# Altium footprint library Package_DFN_QFN.PcbLib: 557 footprints (part 29 of 35)
Each footprint in its own frame and in the unit in brackets; x right, y up, seen from the top. Pads: shape width x height; smd on the part's side, far side on the other; paste and mask are expansions set on the pad; w line width, h text height; cw(c..) or ccw(c..) is an arc to the next point about the centre after c.
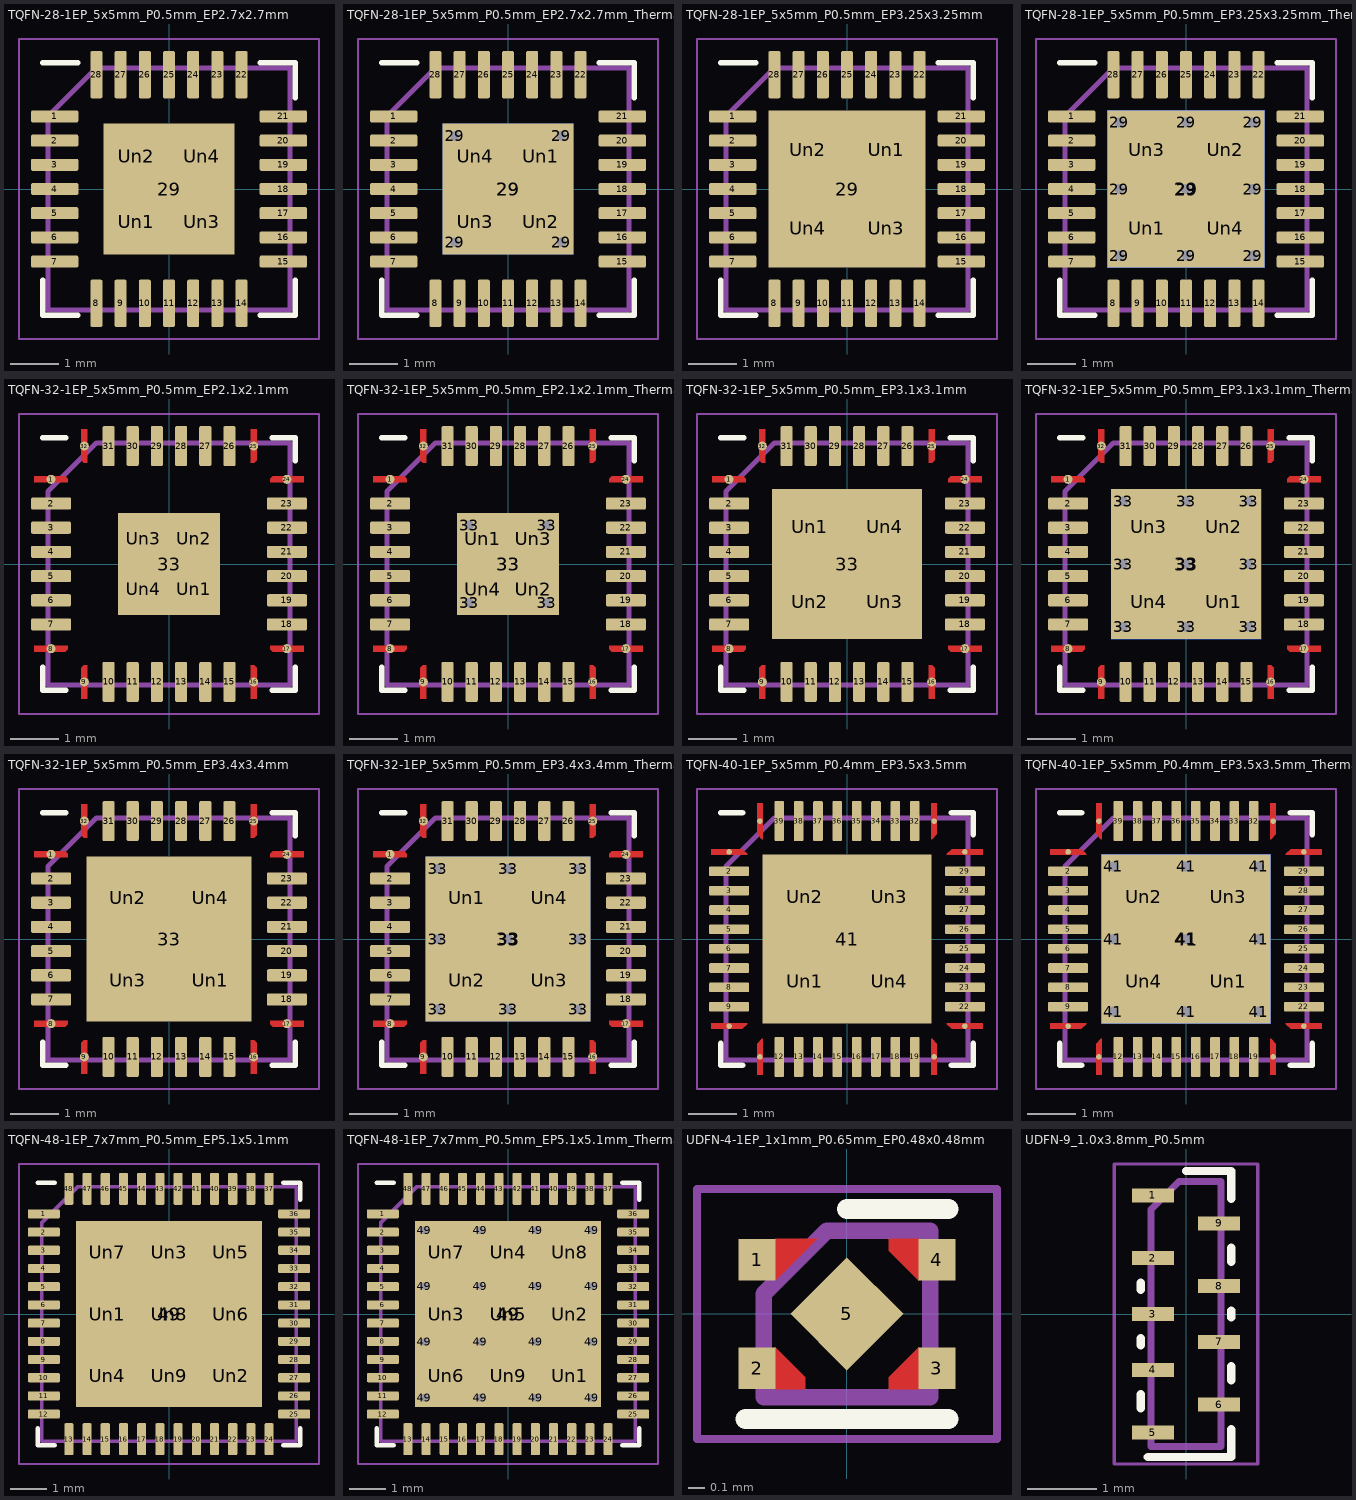
[diagram p28: the footprints below, top view; thin cyan lines are the x and y axes]

## TQFN-28-1EP_5x5mm_P0.5mm_EP2.7x2.7mm [mm]
pads (33):
  rrect25% 0.975x0.25 smd: 1(-2.362,1.5) 2(-2.362,1) 3(-2.362,0.5) 4(-2.362,0) 5(-2.362,-0.5) 6(-2.362,-1) 7(-2.362,-1.5) 15(2.362,-1.5) 16(2.362,-1) 17(2.362,-0.5) 18(2.362,0) 19(2.362,0.5) 20(2.362,1) 21(2.362,1.5)
  rrect25% 0.25x0.975 smd: 8(-1.5,-2.362) 9(-1,-2.362) 10(-0.5,-2.362) 11(0,-2.362) 12(0.5,-2.362) 13(1,-2.362) 14(1.5,-2.362) 22(1.5,2.362) 23(1,2.362) 24(0.5,2.362) 25(0,2.362) 26(-0.5,2.362) 27(-1,2.362) 28(-1.5,2.362)
  rect 2.7x2.7 smd: 29(0,0)
  rrect23% 1.09x1.09 on Top Paste: Un1(-0.675,-0.675) Un2(-0.675,0.675) Un3(0.675,-0.675) Un4(0.675,0.675)
F.SilkS:
  lines w0.12: -2.61,-1.885 -2.61,-2.61 -1.885,-2.61 ; -2.61,2.61 -1.885,2.61 ; 1.885,-2.61 2.61,-2.61 2.61,-1.885 ; 1.885,2.61 2.61,2.61 2.61,1.885
F.CrtYd:
  lines w0.05: -3.1,-3.1 -3.1,3.1 3.1,3.1 3.1,-3.1 -3.1,-3.1
F.Fab:
  lines w0.1: -2.5,-2.5 -2.5,1.5 -1.5,2.5 2.5,2.5 2.5,-2.5 -2.5,-2.5
  text "'.Designator'" at -4.047,-0.84 h1

## TQFN-28-1EP_5x5mm_P0.5mm_EP2.7x2.7mm_ThermalVias [mm]
pads (38):
  rrect25% 0.975x0.25 smd: 1(-2.362,1.5) 2(-2.362,1) 3(-2.362,0.5) 4(-2.362,0) 5(-2.362,-0.5) 6(-2.362,-1) 7(-2.362,-1.5) 15(2.362,-1.5) 16(2.362,-1) 17(2.362,-0.5) 18(2.362,0) 19(2.362,0.5) 20(2.362,1) 21(2.362,1.5)
  rrect25% 0.25x0.975 smd: 8(-1.5,-2.362) 9(-1,-2.362) 10(-0.5,-2.362) 11(0,-2.362) 12(0.5,-2.362) 13(1,-2.362) 14(1.5,-2.362) 22(1.5,2.362) 23(1,2.362) 24(0.5,2.362) 25(0,2.362) 26(-0.5,2.362) 27(-1,2.362) 28(-1.5,2.362)
  round 0.5 hole 0.2: 29(-1.1,-1.1) 29(-1.1,1.1) 29(1.1,-1.1) 29(1.1,1.1)
  rect 2.7x2.7 smd: 29(0,0)
  rect 2.7x2.7 smd far side: 29(0,0)
  rrect21% 1.17x1.17 on Top Paste: Un1(0.675,0.675) Un2(0.675,-0.675) Un3(-0.675,-0.675) Un4(-0.675,0.675)
F.SilkS:
  lines w0.12: -2.61,-1.885 -2.61,-2.61 -1.885,-2.61 ; -2.61,2.61 -1.885,2.61 ; 1.885,-2.61 2.61,-2.61 2.61,-1.885 ; 1.885,2.61 2.61,2.61 2.61,1.885
F.CrtYd:
  lines w0.05: -3.1,-3.1 3.1,-3.1 3.1,3.1 -3.1,3.1 -3.1,-3.1
F.Fab:
  lines w0.1: -2.5,-2.5 -2.5,1.5 -1.5,2.5 2.5,2.5 2.5,-2.5 -2.5,-2.5
  text "'.Designator'" at -4.047,-0.84 h1

## TQFN-28-1EP_5x5mm_P0.5mm_EP3.25x3.25mm [mm]
pads (33):
  rrect25% 0.975x0.25 smd: 1(-2.362,1.5) 2(-2.362,1) 3(-2.362,0.5) 4(-2.362,0) 5(-2.362,-0.5) 6(-2.362,-1) 7(-2.362,-1.5) 15(2.362,-1.5) 16(2.362,-1) 17(2.362,-0.5) 18(2.362,0) 19(2.362,0.5) 20(2.362,1) 21(2.362,1.5)
  rrect25% 0.25x0.975 smd: 8(-1.5,-2.362) 9(-1,-2.362) 10(-0.5,-2.362) 11(0,-2.362) 12(0.5,-2.362) 13(1,-2.362) 14(1.5,-2.362) 22(1.5,2.362) 23(1,2.362) 24(0.5,2.362) 25(0,2.362) 26(-0.5,2.362) 27(-1,2.362) 28(-1.5,2.362)
  rect 3.25x3.25 smd: 29(0,0)
  rrect19% 1.31x1.31 on Top Paste: Un1(0.81,0.81) Un2(-0.81,0.81) Un3(0.81,-0.81) Un4(-0.81,-0.81)
F.SilkS:
  lines w0.12: -2.61,-1.885 -2.61,-2.61 -1.885,-2.61 ; -2.61,2.61 -1.885,2.61 ; 1.885,-2.61 2.61,-2.61 2.61,-1.885 ; 1.885,2.61 2.61,2.61 2.61,1.885
F.CrtYd:
  lines w0.05: -3.1,-3.1 -3.1,3.1 3.1,3.1 3.1,-3.1 -3.1,-3.1
F.Fab:
  lines w0.1: -2.5,-2.5 -2.5,1.5 -1.5,2.5 2.5,2.5 2.5,-2.5 -2.5,-2.5
  text "'.Designator'" at -4.047,-0.84 h1

## TQFN-28-1EP_5x5mm_P0.5mm_EP3.25x3.25mm_ThermalVias [mm]
pads (43):
  rrect25% 0.975x0.25 smd: 1(-2.362,1.5) 2(-2.362,1) 3(-2.362,0.5) 4(-2.362,0) 5(-2.362,-0.5) 6(-2.362,-1) 7(-2.362,-1.5) 15(2.362,-1.5) 16(2.362,-1) 17(2.362,-0.5) 18(2.362,0) 19(2.362,0.5) 20(2.362,1) 21(2.362,1.5)
  rrect25% 0.25x0.975 smd: 8(-1.5,-2.362) 9(-1,-2.362) 10(-0.5,-2.362) 11(0,-2.362) 12(0.5,-2.362) 13(1,-2.362) 14(1.5,-2.362) 22(1.5,2.362) 23(1,2.362) 24(0.5,2.362) 25(0,2.362) 26(-0.5,2.362) 27(-1,2.362) 28(-1.5,2.362)
  round 0.5 hole 0.2: 29(-1.375,-1.375) 29(-1.375,0) 29(-1.375,1.375) 29(0,-1.375) 29(0,0) 29(0,1.375) 29(1.375,-1.375) 29(1.375,0) 29(1.375,1.375)
  rect 3.25x3.25 smd: 29(0,0)
  rect 3.25x3.25 smd far side: 29(0,0)
  rrect18% 1.41x1.41 on Top Paste: Un1(-0.81,-0.81) Un2(0.81,0.81) Un3(-0.81,0.81) Un4(0.81,-0.81)
F.SilkS:
  lines w0.12: -2.61,-1.885 -2.61,-2.61 -1.885,-2.61 ; -2.61,2.61 -1.885,2.61 ; 1.885,-2.61 2.61,-2.61 2.61,-1.885 ; 1.885,2.61 2.61,2.61 2.61,1.885
F.CrtYd:
  lines w0.05: -3.1,-3.1 -3.1,3.1 3.1,3.1 3.1,-3.1 -3.1,-3.1
F.Fab:
  lines w0.1: -2.5,-2.5 -2.5,1.5 -1.5,2.5 2.5,2.5 2.5,-2.5 -2.5,-2.5
  text "'.Designator'" at -4.047,-0.84 h1

## TQFN-32-1EP_5x5mm_P0.5mm_EP2.1x2.1mm [mm]
pads (37):
  round 0.186 smd: 1(-2.438,1.75) 8(-2.438,-1.75) 9(-1.75,-2.438) 16(1.75,-2.438) 17(2.438,-1.75) 24(2.438,1.75) 25(1.75,2.438) 32(-1.75,2.438)
  rrect25% 0.825x0.25 smd: 2(-2.438,1.25) 3(-2.438,0.75) 4(-2.438,0.25) 5(-2.438,-0.25) 6(-2.438,-0.75) 7(-2.438,-1.25) 18(2.438,-1.25) 19(2.438,-0.75) 20(2.438,-0.25) 21(2.438,0.25) 22(2.438,0.75) 23(2.438,1.25)
  rrect25% 0.25x0.825 smd: 10(-1.25,-2.438) 11(-0.75,-2.438) 12(-0.25,-2.438) 13(0.25,-2.438) 14(0.75,-2.438) 15(1.25,-2.438) 26(1.25,2.438) 27(0.75,2.438) 28(0.25,2.438) 29(-0.25,2.438) 30(-0.75,2.438) 31(-1.25,2.438)
  rect 2.1x2.1 smd: 33(0,0)
  rrect25% 0.85x0.85 on Top Paste: Un1(0.525,-0.525) Un2(0.525,0.525) Un3(-0.525,0.525) Un4(-0.525,-0.525)
F.Cu:
  region: -2.088,1.759 -2.088,1.687 -2.788,1.687 -2.788,1.812 -2.141,1.812
  region: -2.088,-1.759 -2.141,-1.812 -2.788,-1.812 -2.788,-1.687 -2.088,-1.687
  region: -1.687,-2.788 -1.812,-2.788 -1.812,-2.141 -1.759,-2.088 -1.687,-2.088
  region: 1.812,-2.141 1.812,-2.788 1.687,-2.788 1.687,-2.088 1.759,-2.088
  region: 2.788,-1.812 2.141,-1.812 2.088,-1.759 2.088,-1.687 2.788,-1.687
  region: 2.788,1.687 2.088,1.687 2.088,1.759 2.141,1.812 2.788,1.812
  region: 1.812,2.141 1.759,2.088 1.687,2.088 1.687,2.788 1.812,2.788
  region: -1.687,2.088 -1.759,2.088 -1.812,2.141 -1.812,2.788 -1.687,2.788
F.SilkS:
  lines w0.12: -2.61,-2.135 -2.61,-2.61 -2.135,-2.61 ; -2.61,2.61 -2.135,2.61 ; 2.135,-2.61 2.61,-2.61 2.61,-2.135 ; 2.135,2.61 2.61,2.61 2.61,2.135
F.Paste:
  region: -2.088,1.759 -2.088,1.687 -2.788,1.687 -2.788,1.812 -2.141,1.812
  region: -2.088,-1.759 -2.141,-1.812 -2.788,-1.812 -2.788,-1.687 -2.088,-1.687
  region: -1.687,-2.788 -1.812,-2.788 -1.812,-2.141 -1.759,-2.088 -1.687,-2.088
  region: 1.812,-2.141 1.812,-2.788 1.687,-2.788 1.687,-2.088 1.759,-2.088
  region: 2.788,-1.812 2.141,-1.812 2.088,-1.759 2.088,-1.687 2.788,-1.687
  region: 2.788,1.687 2.088,1.687 2.088,1.759 2.141,1.812 2.788,1.812
  region: 1.812,2.141 1.759,2.088 1.687,2.088 1.687,2.788 1.812,2.788
  region: -1.687,2.088 -1.759,2.088 -1.812,2.141 -1.812,2.788 -1.687,2.788
F.Mask:
  region: -2.088,1.759 -2.088,1.687 -2.788,1.687 -2.788,1.812 -2.141,1.812
  region: -2.088,-1.759 -2.141,-1.812 -2.788,-1.812 -2.788,-1.687 -2.088,-1.687
  region: -1.687,-2.788 -1.812,-2.788 -1.812,-2.141 -1.759,-2.088 -1.687,-2.088
  region: 1.812,-2.141 1.812,-2.788 1.687,-2.788 1.687,-2.088 1.759,-2.088
  region: 2.788,-1.812 2.141,-1.812 2.088,-1.759 2.088,-1.687 2.788,-1.687
  region: 2.788,1.687 2.088,1.687 2.088,1.759 2.141,1.812 2.788,1.812
  region: 1.812,2.141 1.759,2.088 1.687,2.088 1.687,2.788 1.812,2.788
  region: -1.687,2.088 -1.759,2.088 -1.812,2.141 -1.812,2.788 -1.687,2.788
F.CrtYd:
  lines w0.05: -3.1,-3.1 3.1,-3.1 3.1,3.1 -3.1,3.1 -3.1,-3.1
F.Fab:
  lines w0.1: -2.5,-2.5 2.5,-2.5 2.5,2.5 -1.5,2.5 -2.5,1.5 -2.5,-2.5
  text "'.Designator'" at -4.047,-0.84 h1

## TQFN-32-1EP_5x5mm_P0.5mm_EP2.1x2.1mm_ThermalVias [mm]
pads (42):
  round 0.186 smd: 1(-2.438,1.75) 8(-2.438,-1.75) 9(-1.75,-2.438) 16(1.75,-2.438) 17(2.438,-1.75) 24(2.438,1.75) 25(1.75,2.438) 32(-1.75,2.438)
  rrect25% 0.825x0.25 smd: 2(-2.438,1.25) 3(-2.438,0.75) 4(-2.438,0.25) 5(-2.438,-0.25) 6(-2.438,-0.75) 7(-2.438,-1.25) 18(2.438,-1.25) 19(2.438,-0.75) 20(2.438,-0.25) 21(2.438,0.25) 22(2.438,0.75) 23(2.438,1.25)
  rrect25% 0.25x0.825 smd: 10(-1.25,-2.438) 11(-0.75,-2.438) 12(-0.25,-2.438) 13(0.25,-2.438) 14(0.75,-2.438) 15(1.25,-2.438) 26(1.25,2.438) 27(0.75,2.438) 28(0.25,2.438) 29(-0.25,2.438) 30(-0.75,2.438) 31(-1.25,2.438)
  round 0.5 hole 0.2: 33(-0.8,-0.8) 33(-0.8,0.8) 33(0.8,-0.8) 33(0.8,0.8)
  rect 2.1x2.1 smd far side: 33(0,0)
  rect 2.1x2.1 smd: 33(0,0)
  rrect25% 0.91x0.91 on Top Paste: Un1(-0.525,0.525) Un2(0.525,-0.525) Un3(0.525,0.525) Un4(-0.525,-0.525)
F.Cu:
  region: -2.088,1.759 -2.088,1.687 -2.788,1.687 -2.788,1.812 -2.141,1.812
  region: -2.088,-1.759 -2.141,-1.812 -2.788,-1.812 -2.788,-1.687 -2.088,-1.687
  region: -1.687,-2.788 -1.812,-2.788 -1.812,-2.141 -1.759,-2.088 -1.687,-2.088
  region: 1.812,-2.141 1.812,-2.788 1.687,-2.788 1.687,-2.088 1.759,-2.088
  region: 2.788,-1.812 2.141,-1.812 2.088,-1.759 2.088,-1.687 2.788,-1.687
  region: 2.788,1.687 2.088,1.687 2.088,1.759 2.141,1.812 2.788,1.812
  region: 1.812,2.141 1.759,2.088 1.687,2.088 1.687,2.788 1.812,2.788
  region: -1.687,2.088 -1.759,2.088 -1.812,2.141 -1.812,2.788 -1.687,2.788
F.SilkS:
  lines w0.12: -2.61,-2.135 -2.61,-2.61 -2.135,-2.61 ; -2.61,2.61 -2.135,2.61 ; 2.135,-2.61 2.61,-2.61 2.61,-2.135 ; 2.135,2.61 2.61,2.61 2.61,2.135
F.Paste:
  region: -2.088,1.759 -2.088,1.687 -2.788,1.687 -2.788,1.812 -2.141,1.812
  region: -2.088,-1.759 -2.141,-1.812 -2.788,-1.812 -2.788,-1.687 -2.088,-1.687
  region: -1.687,-2.788 -1.812,-2.788 -1.812,-2.141 -1.759,-2.088 -1.687,-2.088
  region: 1.812,-2.141 1.812,-2.788 1.687,-2.788 1.687,-2.088 1.759,-2.088
  region: 2.788,-1.812 2.141,-1.812 2.088,-1.759 2.088,-1.687 2.788,-1.687
  region: 2.788,1.687 2.088,1.687 2.088,1.759 2.141,1.812 2.788,1.812
  region: 1.812,2.141 1.759,2.088 1.687,2.088 1.687,2.788 1.812,2.788
  region: -1.687,2.088 -1.759,2.088 -1.812,2.141 -1.812,2.788 -1.687,2.788
F.Mask:
  region: -2.088,1.759 -2.088,1.687 -2.788,1.687 -2.788,1.812 -2.141,1.812
  region: -2.088,-1.759 -2.141,-1.812 -2.788,-1.812 -2.788,-1.687 -2.088,-1.687
  region: -1.687,-2.788 -1.812,-2.788 -1.812,-2.141 -1.759,-2.088 -1.687,-2.088
  region: 1.812,-2.141 1.812,-2.788 1.687,-2.788 1.687,-2.088 1.759,-2.088
  region: 2.788,-1.812 2.141,-1.812 2.088,-1.759 2.088,-1.687 2.788,-1.687
  region: 2.788,1.687 2.088,1.687 2.088,1.759 2.141,1.812 2.788,1.812
  region: 1.812,2.141 1.759,2.088 1.687,2.088 1.687,2.788 1.812,2.788
  region: -1.687,2.088 -1.759,2.088 -1.812,2.141 -1.812,2.788 -1.687,2.788
F.CrtYd:
  lines w0.05: -3.1,-3.1 -3.1,3.1 3.1,3.1 3.1,-3.1 -3.1,-3.1
F.Fab:
  lines w0.1: -2.5,-2.5 -2.5,1.5 -1.5,2.5 2.5,2.5 2.5,-2.5 -2.5,-2.5
  text "'.Designator'" at -4.047,-0.84 h1

## TQFN-32-1EP_5x5mm_P0.5mm_EP3.1x3.1mm [mm]
pads (37):
  round 0.186 smd: 1(-2.438,1.75) 8(-2.438,-1.75) 9(-1.75,-2.438) 16(1.75,-2.438) 17(2.438,-1.75) 24(2.438,1.75) 25(1.75,2.438) 32(-1.75,2.438)
  rrect25% 0.825x0.25 smd: 2(-2.438,1.25) 3(-2.438,0.75) 4(-2.438,0.25) 5(-2.438,-0.25) 6(-2.438,-0.75) 7(-2.438,-1.25) 18(2.438,-1.25) 19(2.438,-0.75) 20(2.438,-0.25) 21(2.438,0.25) 22(2.438,0.75) 23(2.438,1.25)
  rrect25% 0.25x0.825 smd: 10(-1.25,-2.438) 11(-0.75,-2.438) 12(-0.25,-2.438) 13(0.25,-2.438) 14(0.75,-2.438) 15(1.25,-2.438) 26(1.25,2.438) 27(0.75,2.438) 28(0.25,2.438) 29(-0.25,2.438) 30(-0.75,2.438) 31(-1.25,2.438)
  rect 3.1x3.1 smd: 33(0,0)
  rrect20% 1.25x1.25 on Top Paste: Un1(-0.775,0.775) Un2(-0.775,-0.775) Un3(0.775,-0.775) Un4(0.775,0.775)
F.Cu:
  region: -2.088,1.759 -2.088,1.687 -2.788,1.687 -2.788,1.812 -2.141,1.812
  region: -2.088,-1.759 -2.141,-1.812 -2.788,-1.812 -2.788,-1.687 -2.088,-1.687
  region: -1.687,-2.788 -1.812,-2.788 -1.812,-2.141 -1.759,-2.088 -1.687,-2.088
  region: 1.812,-2.141 1.812,-2.788 1.687,-2.788 1.687,-2.088 1.759,-2.088
  region: 2.788,-1.812 2.141,-1.812 2.088,-1.759 2.088,-1.687 2.788,-1.687
  region: 2.788,1.687 2.088,1.687 2.088,1.759 2.141,1.812 2.788,1.812
  region: 1.812,2.141 1.759,2.088 1.687,2.088 1.687,2.788 1.812,2.788
  region: -1.687,2.088 -1.759,2.088 -1.812,2.141 -1.812,2.788 -1.687,2.788
F.SilkS:
  lines w0.12: -2.61,-2.135 -2.61,-2.61 -2.135,-2.61 ; -2.61,2.61 -2.135,2.61 ; 2.135,-2.61 2.61,-2.61 2.61,-2.135 ; 2.135,2.61 2.61,2.61 2.61,2.135
F.Paste:
  region: -2.088,1.759 -2.088,1.687 -2.788,1.687 -2.788,1.812 -2.141,1.812
  region: -2.088,-1.759 -2.141,-1.812 -2.788,-1.812 -2.788,-1.687 -2.088,-1.687
  region: -1.687,-2.788 -1.812,-2.788 -1.812,-2.141 -1.759,-2.088 -1.687,-2.088
  region: 1.812,-2.141 1.812,-2.788 1.687,-2.788 1.687,-2.088 1.759,-2.088
  region: 2.788,-1.812 2.141,-1.812 2.088,-1.759 2.088,-1.687 2.788,-1.687
  region: 2.788,1.687 2.088,1.687 2.088,1.759 2.141,1.812 2.788,1.812
  region: 1.812,2.141 1.759,2.088 1.687,2.088 1.687,2.788 1.812,2.788
  region: -1.687,2.088 -1.759,2.088 -1.812,2.141 -1.812,2.788 -1.687,2.788
F.Mask:
  region: -2.088,1.759 -2.088,1.687 -2.788,1.687 -2.788,1.812 -2.141,1.812
  region: -2.088,-1.759 -2.141,-1.812 -2.788,-1.812 -2.788,-1.687 -2.088,-1.687
  region: -1.687,-2.788 -1.812,-2.788 -1.812,-2.141 -1.759,-2.088 -1.687,-2.088
  region: 1.812,-2.141 1.812,-2.788 1.687,-2.788 1.687,-2.088 1.759,-2.088
  region: 2.788,-1.812 2.141,-1.812 2.088,-1.759 2.088,-1.687 2.788,-1.687
  region: 2.788,1.687 2.088,1.687 2.088,1.759 2.141,1.812 2.788,1.812
  region: 1.812,2.141 1.759,2.088 1.687,2.088 1.687,2.788 1.812,2.788
  region: -1.687,2.088 -1.759,2.088 -1.812,2.141 -1.812,2.788 -1.687,2.788
F.CrtYd:
  lines w0.05: -3.1,-3.1 3.1,-3.1 3.1,3.1 -3.1,3.1 -3.1,-3.1
F.Fab:
  lines w0.1: -2.5,-2.5 2.5,-2.5 2.5,2.5 -1.5,2.5 -2.5,1.5 -2.5,-2.5
  text "'.Designator'" at -4.047,-0.84 h1

## TQFN-32-1EP_5x5mm_P0.5mm_EP3.1x3.1mm_ThermalVias [mm]
pads (47):
  round 0.186 smd: 1(-2.438,1.75) 8(-2.438,-1.75) 9(-1.75,-2.438) 16(1.75,-2.438) 17(2.438,-1.75) 24(2.438,1.75) 25(1.75,2.438) 32(-1.75,2.438)
  rrect25% 0.825x0.25 smd: 2(-2.438,1.25) 3(-2.438,0.75) 4(-2.438,0.25) 5(-2.438,-0.25) 6(-2.438,-0.75) 7(-2.438,-1.25) 18(2.438,-1.25) 19(2.438,-0.75) 20(2.438,-0.25) 21(2.438,0.25) 22(2.438,0.75) 23(2.438,1.25)
  rrect25% 0.25x0.825 smd: 10(-1.25,-2.438) 11(-0.75,-2.438) 12(-0.25,-2.438) 13(0.25,-2.438) 14(0.75,-2.438) 15(1.25,-2.438) 26(1.25,2.438) 27(0.75,2.438) 28(0.25,2.438) 29(-0.25,2.438) 30(-0.75,2.438) 31(-1.25,2.438)
  round 0.5 hole 0.2: 33(-1.3,-1.3) 33(-1.3,0) 33(-1.3,1.3) 33(0,-1.3) 33(0,0) 33(0,1.3) 33(1.3,-1.3) 33(1.3,0) 33(1.3,1.3)
  rect 3.1x3.1 smd: 33(0,0)
  rect 3.1x3.1 smd far side: 33(0,0)
  rrect19% 1.34x1.34 on Top Paste: Un1(0.775,-0.775) Un2(0.775,0.775) Un3(-0.775,0.775) Un4(-0.775,-0.775)
F.Cu:
  region: -2.088,1.759 -2.088,1.687 -2.788,1.687 -2.788,1.812 -2.141,1.812
  region: -2.088,-1.759 -2.141,-1.812 -2.788,-1.812 -2.788,-1.687 -2.088,-1.687
  region: -1.687,-2.788 -1.812,-2.788 -1.812,-2.141 -1.759,-2.088 -1.687,-2.088
  region: 1.812,-2.141 1.812,-2.788 1.687,-2.788 1.687,-2.088 1.759,-2.088
  region: 2.788,-1.812 2.141,-1.812 2.088,-1.759 2.088,-1.687 2.788,-1.687
  region: 2.788,1.687 2.088,1.687 2.088,1.759 2.141,1.812 2.788,1.812
  region: 1.812,2.141 1.759,2.088 1.687,2.088 1.687,2.788 1.812,2.788
  region: -1.687,2.088 -1.759,2.088 -1.812,2.141 -1.812,2.788 -1.687,2.788
F.SilkS:
  lines w0.12: -2.61,-2.135 -2.61,-2.61 -2.135,-2.61 ; -2.61,2.61 -2.135,2.61 ; 2.135,-2.61 2.61,-2.61 2.61,-2.135 ; 2.135,2.61 2.61,2.61 2.61,2.135
F.Paste:
  region: -2.088,1.759 -2.088,1.687 -2.788,1.687 -2.788,1.812 -2.141,1.812
  region: -2.088,-1.759 -2.141,-1.812 -2.788,-1.812 -2.788,-1.687 -2.088,-1.687
  region: -1.687,-2.788 -1.812,-2.788 -1.812,-2.141 -1.759,-2.088 -1.687,-2.088
  region: 1.812,-2.141 1.812,-2.788 1.687,-2.788 1.687,-2.088 1.759,-2.088
  region: 2.788,-1.812 2.141,-1.812 2.088,-1.759 2.088,-1.687 2.788,-1.687
  region: 2.788,1.687 2.088,1.687 2.088,1.759 2.141,1.812 2.788,1.812
  region: 1.812,2.141 1.759,2.088 1.687,2.088 1.687,2.788 1.812,2.788
  region: -1.687,2.088 -1.759,2.088 -1.812,2.141 -1.812,2.788 -1.687,2.788
F.Mask:
  region: -2.088,1.759 -2.088,1.687 -2.788,1.687 -2.788,1.812 -2.141,1.812
  region: -2.088,-1.759 -2.141,-1.812 -2.788,-1.812 -2.788,-1.687 -2.088,-1.687
  region: -1.687,-2.788 -1.812,-2.788 -1.812,-2.141 -1.759,-2.088 -1.687,-2.088
  region: 1.812,-2.141 1.812,-2.788 1.687,-2.788 1.687,-2.088 1.759,-2.088
  region: 2.788,-1.812 2.141,-1.812 2.088,-1.759 2.088,-1.687 2.788,-1.687
  region: 2.788,1.687 2.088,1.687 2.088,1.759 2.141,1.812 2.788,1.812
  region: 1.812,2.141 1.759,2.088 1.687,2.088 1.687,2.788 1.812,2.788
  region: -1.687,2.088 -1.759,2.088 -1.812,2.141 -1.812,2.788 -1.687,2.788
F.CrtYd:
  lines w0.05: -3.1,-3.1 -3.1,3.1 3.1,3.1 3.1,-3.1 -3.1,-3.1
F.Fab:
  lines w0.1: -2.5,-2.5 2.5,-2.5 2.5,2.5 -1.5,2.5 -2.5,1.5 -2.5,-2.5
  text "'.Designator'" at -4.047,-0.84 h1

## TQFN-32-1EP_5x5mm_P0.5mm_EP3.4x3.4mm [mm]
pads (37):
  round 0.186 smd: 1(-2.438,1.75) 8(-2.438,-1.75) 9(-1.75,-2.438) 16(1.75,-2.438) 17(2.438,-1.75) 24(2.438,1.75) 25(1.75,2.438) 32(-1.75,2.438)
  rrect25% 0.825x0.25 smd: 2(-2.438,1.25) 3(-2.438,0.75) 4(-2.438,0.25) 5(-2.438,-0.25) 6(-2.438,-0.75) 7(-2.438,-1.25) 18(2.438,-1.25) 19(2.438,-0.75) 20(2.438,-0.25) 21(2.438,0.25) 22(2.438,0.75) 23(2.438,1.25)
  rrect25% 0.25x0.825 smd: 10(-1.25,-2.438) 11(-0.75,-2.438) 12(-0.25,-2.438) 13(0.25,-2.438) 14(0.75,-2.438) 15(1.25,-2.438) 26(1.25,2.438) 27(0.75,2.438) 28(0.25,2.438) 29(-0.25,2.438) 30(-0.75,2.438) 31(-1.25,2.438)
  rect 3.4x3.4 smd: 33(0,0)
  rrect18% 1.37x1.37 on Top Paste: Un1(0.85,-0.85) Un2(-0.85,0.85) Un3(-0.85,-0.85) Un4(0.85,0.85)
F.Cu:
  region: -2.088,1.759 -2.088,1.687 -2.788,1.687 -2.788,1.812 -2.141,1.812
  region: -2.088,-1.759 -2.141,-1.812 -2.788,-1.812 -2.788,-1.687 -2.088,-1.687
  region: -1.687,-2.788 -1.812,-2.788 -1.812,-2.141 -1.759,-2.088 -1.687,-2.088
  region: 1.812,-2.141 1.812,-2.788 1.687,-2.788 1.687,-2.088 1.759,-2.088
  region: 2.788,-1.812 2.141,-1.812 2.088,-1.759 2.088,-1.687 2.788,-1.687
  region: 2.788,1.687 2.088,1.687 2.088,1.759 2.141,1.812 2.788,1.812
  region: 1.812,2.141 1.759,2.088 1.687,2.088 1.687,2.788 1.812,2.788
  region: -1.687,2.088 -1.759,2.088 -1.812,2.141 -1.812,2.788 -1.687,2.788
F.SilkS:
  lines w0.12: -2.61,-2.135 -2.61,-2.61 -2.135,-2.61 ; -2.61,2.61 -2.135,2.61 ; 2.135,-2.61 2.61,-2.61 2.61,-2.135 ; 2.135,2.61 2.61,2.61 2.61,2.135
F.Paste:
  region: -2.088,1.759 -2.088,1.687 -2.788,1.687 -2.788,1.812 -2.141,1.812
  region: -2.088,-1.759 -2.141,-1.812 -2.788,-1.812 -2.788,-1.687 -2.088,-1.687
  region: -1.687,-2.788 -1.812,-2.788 -1.812,-2.141 -1.759,-2.088 -1.687,-2.088
  region: 1.812,-2.141 1.812,-2.788 1.687,-2.788 1.687,-2.088 1.759,-2.088
  region: 2.788,-1.812 2.141,-1.812 2.088,-1.759 2.088,-1.687 2.788,-1.687
  region: 2.788,1.687 2.088,1.687 2.088,1.759 2.141,1.812 2.788,1.812
  region: 1.812,2.141 1.759,2.088 1.687,2.088 1.687,2.788 1.812,2.788
  region: -1.687,2.088 -1.759,2.088 -1.812,2.141 -1.812,2.788 -1.687,2.788
F.Mask:
  region: -2.088,1.759 -2.088,1.687 -2.788,1.687 -2.788,1.812 -2.141,1.812
  region: -2.088,-1.759 -2.141,-1.812 -2.788,-1.812 -2.788,-1.687 -2.088,-1.687
  region: -1.687,-2.788 -1.812,-2.788 -1.812,-2.141 -1.759,-2.088 -1.687,-2.088
  region: 1.812,-2.141 1.812,-2.788 1.687,-2.788 1.687,-2.088 1.759,-2.088
  region: 2.788,-1.812 2.141,-1.812 2.088,-1.759 2.088,-1.687 2.788,-1.687
  region: 2.788,1.687 2.088,1.687 2.088,1.759 2.141,1.812 2.788,1.812
  region: 1.812,2.141 1.759,2.088 1.687,2.088 1.687,2.788 1.812,2.788
  region: -1.687,2.088 -1.759,2.088 -1.812,2.141 -1.812,2.788 -1.687,2.788
F.CrtYd:
  lines w0.05: -3.1,-3.1 -3.1,3.1 3.1,3.1 3.1,-3.1 -3.1,-3.1
F.Fab:
  lines w0.1: -2.5,-2.5 2.5,-2.5 2.5,2.5 -1.5,2.5 -2.5,1.5 -2.5,-2.5
  text "'.Designator'" at -4.047,-0.84 h1

## TQFN-32-1EP_5x5mm_P0.5mm_EP3.4x3.4mm_ThermalVias [mm]
pads (47):
  round 0.186 smd: 1(-2.438,1.75) 8(-2.438,-1.75) 9(-1.75,-2.438) 16(1.75,-2.438) 17(2.438,-1.75) 24(2.438,1.75) 25(1.75,2.438) 32(-1.75,2.438)
  rrect25% 0.825x0.25 smd: 2(-2.438,1.25) 3(-2.438,0.75) 4(-2.438,0.25) 5(-2.438,-0.25) 6(-2.438,-0.75) 7(-2.438,-1.25) 18(2.438,-1.25) 19(2.438,-0.75) 20(2.438,-0.25) 21(2.438,0.25) 22(2.438,0.75) 23(2.438,1.25)
  rrect25% 0.25x0.825 smd: 10(-1.25,-2.438) 11(-0.75,-2.438) 12(-0.25,-2.438) 13(0.25,-2.438) 14(0.75,-2.438) 15(1.25,-2.438) 26(1.25,2.438) 27(0.75,2.438) 28(0.25,2.438) 29(-0.25,2.438) 30(-0.75,2.438) 31(-1.25,2.438)
  round 0.5 hole 0.2: 33(-1.45,-1.45) 33(-1.45,0) 33(-1.45,1.45) 33(0,-1.45) 33(0,0) 33(0,1.45) 33(1.45,-1.45) 33(1.45,0) 33(1.45,1.45)
  rect 3.4x3.4 smd far side: 33(0,0)
  rect 3.4x3.4 smd: 33(0,0)
  rrect17% 1.47x1.47 on Top Paste: Un1(-0.85,0.85) Un2(-0.85,-0.85) Un3(0.85,-0.85) Un4(0.85,0.85)
F.Cu:
  region: -2.088,1.759 -2.088,1.687 -2.788,1.687 -2.788,1.812 -2.141,1.812
  region: -2.088,-1.759 -2.141,-1.812 -2.788,-1.812 -2.788,-1.687 -2.088,-1.687
  region: -1.687,-2.788 -1.812,-2.788 -1.812,-2.141 -1.759,-2.088 -1.687,-2.088
  region: 1.812,-2.141 1.812,-2.788 1.687,-2.788 1.687,-2.088 1.759,-2.088
  region: 2.788,-1.812 2.141,-1.812 2.088,-1.759 2.088,-1.687 2.788,-1.687
  region: 2.788,1.687 2.088,1.687 2.088,1.759 2.141,1.812 2.788,1.812
  region: 1.812,2.141 1.759,2.088 1.687,2.088 1.687,2.788 1.812,2.788
  region: -1.687,2.088 -1.759,2.088 -1.812,2.141 -1.812,2.788 -1.687,2.788
F.SilkS:
  lines w0.12: -2.61,-2.135 -2.61,-2.61 -2.135,-2.61 ; -2.61,2.61 -2.135,2.61 ; 2.135,-2.61 2.61,-2.61 2.61,-2.135 ; 2.135,2.61 2.61,2.61 2.61,2.135
F.Paste:
  region: -2.088,1.759 -2.088,1.687 -2.788,1.687 -2.788,1.812 -2.141,1.812
  region: -2.088,-1.759 -2.141,-1.812 -2.788,-1.812 -2.788,-1.687 -2.088,-1.687
  region: -1.687,-2.788 -1.812,-2.788 -1.812,-2.141 -1.759,-2.088 -1.687,-2.088
  region: 1.812,-2.141 1.812,-2.788 1.687,-2.788 1.687,-2.088 1.759,-2.088
  region: 2.788,-1.812 2.141,-1.812 2.088,-1.759 2.088,-1.687 2.788,-1.687
  region: 2.788,1.687 2.088,1.687 2.088,1.759 2.141,1.812 2.788,1.812
  region: 1.812,2.141 1.759,2.088 1.687,2.088 1.687,2.788 1.812,2.788
  region: -1.687,2.088 -1.759,2.088 -1.812,2.141 -1.812,2.788 -1.687,2.788
F.Mask:
  region: -2.088,1.759 -2.088,1.687 -2.788,1.687 -2.788,1.812 -2.141,1.812
  region: -2.088,-1.759 -2.141,-1.812 -2.788,-1.812 -2.788,-1.687 -2.088,-1.687
  region: -1.687,-2.788 -1.812,-2.788 -1.812,-2.141 -1.759,-2.088 -1.687,-2.088
  region: 1.812,-2.141 1.812,-2.788 1.687,-2.788 1.687,-2.088 1.759,-2.088
  region: 2.788,-1.812 2.141,-1.812 2.088,-1.759 2.088,-1.687 2.788,-1.687
  region: 2.788,1.687 2.088,1.687 2.088,1.759 2.141,1.812 2.788,1.812
  region: 1.812,2.141 1.759,2.088 1.687,2.088 1.687,2.788 1.812,2.788
  region: -1.687,2.088 -1.759,2.088 -1.812,2.141 -1.812,2.788 -1.687,2.788
F.CrtYd:
  lines w0.05: -3.1,-3.1 3.1,-3.1 3.1,3.1 -3.1,3.1 -3.1,-3.1
F.Fab:
  lines w0.1: -2.5,-2.5 -2.5,1.5 -1.5,2.5 2.5,2.5 2.5,-2.5 -2.5,-2.5
  text "'.Designator'" at -4.047,-0.84 h1

## TQFN-40-1EP_5x5mm_P0.4mm_EP3.5x3.5mm [mm]
pads (45):
  round 0.115 smd: 1(-2.438,1.8) 10(-2.438,-1.8) 11(-1.8,-2.438) 20(1.8,-2.438) 21(2.438,-1.8) 30(2.438,1.8) 31(1.8,2.438) 40(-1.8,2.438)
  rrect25% 0.825x0.2 smd: 2(-2.438,1.4) 3(-2.438,1) 4(-2.438,0.6) 5(-2.438,0.2) 6(-2.438,-0.2) 7(-2.438,-0.6) 8(-2.438,-1) 9(-2.438,-1.4) 22(2.438,-1.4) 23(2.438,-1) 24(2.438,-0.6) 25(2.438,-0.2) 26(2.438,0.2) 27(2.438,0.6) 28(2.438,1) 29(2.438,1.4)
  rrect25% 0.2x0.825 smd: 12(-1.4,-2.438) 13(-1,-2.438) 14(-0.6,-2.438) 15(-0.2,-2.438) 16(0.2,-2.438) 17(0.6,-2.438) 18(1,-2.438) 19(1.4,-2.438) 32(1.4,2.438) 33(1,2.438) 34(0.6,2.438) 35(0.2,2.438) 36(-0.2,2.438) 37(-0.6,2.438) 38(-1,2.438) 39(-1.4,2.438)
  rect 3.5x3.5 smd: 41(0,0)
  rrect18% 1.41x1.41 on Top Paste: Un1(-0.875,-0.875) Un2(-0.875,0.875) Un3(0.875,0.875) Un4(0.875,-0.875)
F.Cu:
  region: -2.065,1.763 -2.065,1.74 -2.81,1.74 -2.81,1.86 -2.162,1.86
  region: -2.065,-1.763 -2.162,-1.86 -2.81,-1.86 -2.81,-1.74 -2.065,-1.74
  region: -1.74,-2.81 -1.86,-2.81 -1.86,-2.162 -1.763,-2.065 -1.74,-2.065
  region: 1.86,-2.162 1.86,-2.81 1.74,-2.81 1.74,-2.065 1.763,-2.065
  region: 2.81,-1.86 2.162,-1.86 2.065,-1.763 2.065,-1.74 2.81,-1.74
  region: 2.81,1.74 2.065,1.74 2.065,1.763 2.162,1.86 2.81,1.86
  region: 1.86,2.162 1.763,2.065 1.74,2.065 1.74,2.81 1.86,2.81
  region: -1.74,2.065 -1.763,2.065 -1.86,2.162 -1.86,2.81 -1.74,2.81
F.SilkS:
  lines w0.12: -2.61,-2.16 -2.61,-2.61 -2.16,-2.61 ; -2.61,2.61 -2.16,2.61 ; 2.16,-2.61 2.61,-2.61 2.61,-2.16 ; 2.16,2.61 2.61,2.61 2.61,2.16
F.Paste:
  region: -2.065,1.763 -2.065,1.74 -2.81,1.74 -2.81,1.86 -2.162,1.86
  region: -2.065,-1.763 -2.162,-1.86 -2.81,-1.86 -2.81,-1.74 -2.065,-1.74
  region: -1.74,-2.81 -1.86,-2.81 -1.86,-2.162 -1.763,-2.065 -1.74,-2.065
  region: 1.86,-2.162 1.86,-2.81 1.74,-2.81 1.74,-2.065 1.763,-2.065
  region: 2.81,-1.86 2.162,-1.86 2.065,-1.763 2.065,-1.74 2.81,-1.74
  region: 2.81,1.74 2.065,1.74 2.065,1.763 2.162,1.86 2.81,1.86
  region: 1.86,2.162 1.763,2.065 1.74,2.065 1.74,2.81 1.86,2.81
  region: -1.74,2.065 -1.763,2.065 -1.86,2.162 -1.86,2.81 -1.74,2.81
F.Mask:
  region: -2.065,1.763 -2.065,1.74 -2.81,1.74 -2.81,1.86 -2.162,1.86
  region: -2.065,-1.763 -2.162,-1.86 -2.81,-1.86 -2.81,-1.74 -2.065,-1.74
  region: -1.74,-2.81 -1.86,-2.81 -1.86,-2.162 -1.763,-2.065 -1.74,-2.065
  region: 1.86,-2.162 1.86,-2.81 1.74,-2.81 1.74,-2.065 1.763,-2.065
  region: 2.81,-1.86 2.162,-1.86 2.065,-1.763 2.065,-1.74 2.81,-1.74
  region: 2.81,1.74 2.065,1.74 2.065,1.763 2.162,1.86 2.81,1.86
  region: 1.86,2.162 1.763,2.065 1.74,2.065 1.74,2.81 1.86,2.81
  region: -1.74,2.065 -1.763,2.065 -1.86,2.162 -1.86,2.81 -1.74,2.81
F.CrtYd:
  lines w0.05: -3.1,-3.1 3.1,-3.1 3.1,3.1 -3.1,3.1 -3.1,-3.1
F.Fab:
  lines w0.1: -2.5,-2.5 2.5,-2.5 2.5,2.5 -1.5,2.5 -2.5,1.5 -2.5,-2.5
  text "'.Designator'" at -4.047,-0.84 h1

## TQFN-40-1EP_5x5mm_P0.4mm_EP3.5x3.5mm_ThermalVias [mm]
pads (55):
  round 0.115 smd: 1(-2.438,1.8) 10(-2.438,-1.8) 11(-1.8,-2.438) 20(1.8,-2.438) 21(2.438,-1.8) 30(2.438,1.8) 31(1.8,2.438) 40(-1.8,2.438)
  rrect25% 0.825x0.2 smd: 2(-2.438,1.4) 3(-2.438,1) 4(-2.438,0.6) 5(-2.438,0.2) 6(-2.438,-0.2) 7(-2.438,-0.6) 8(-2.438,-1) 9(-2.438,-1.4) 22(2.438,-1.4) 23(2.438,-1) 24(2.438,-0.6) 25(2.438,-0.2) 26(2.438,0.2) 27(2.438,0.6) 28(2.438,1) 29(2.438,1.4)
  rrect25% 0.2x0.825 smd: 12(-1.4,-2.438) 13(-1,-2.438) 14(-0.6,-2.438) 15(-0.2,-2.438) 16(0.2,-2.438) 17(0.6,-2.438) 18(1,-2.438) 19(1.4,-2.438) 32(1.4,2.438) 33(1,2.438) 34(0.6,2.438) 35(0.2,2.438) 36(-0.2,2.438) 37(-0.6,2.438) 38(-1,2.438) 39(-1.4,2.438)
  round 0.5 hole 0.2: 41(-1.5,-1.5) 41(-1.5,0) 41(-1.5,1.5) 41(0,-1.5) 41(0,0) 41(0,1.5) 41(1.5,-1.5) 41(1.5,0) 41(1.5,1.5)
  rect 3.5x3.5 smd: 41(0,0)
  rect 3.5x3.5 smd far side: 41(0,0)
  rrect16% 1.52x1.52 on Top Paste: Un1(0.875,-0.875) Un2(-0.875,0.875) Un3(0.875,0.875) Un4(-0.875,-0.875)
F.Cu:
  region: -2.065,1.763 -2.065,1.74 -2.81,1.74 -2.81,1.86 -2.162,1.86
  region: -2.065,-1.763 -2.162,-1.86 -2.81,-1.86 -2.81,-1.74 -2.065,-1.74
  region: -1.74,-2.81 -1.86,-2.81 -1.86,-2.162 -1.763,-2.065 -1.74,-2.065
  region: 1.86,-2.162 1.86,-2.81 1.74,-2.81 1.74,-2.065 1.763,-2.065
  region: 2.81,-1.86 2.162,-1.86 2.065,-1.763 2.065,-1.74 2.81,-1.74
  region: 2.81,1.74 2.065,1.74 2.065,1.763 2.162,1.86 2.81,1.86
  region: 1.86,2.162 1.763,2.065 1.74,2.065 1.74,2.81 1.86,2.81
  region: -1.74,2.065 -1.763,2.065 -1.86,2.162 -1.86,2.81 -1.74,2.81
F.SilkS:
  lines w0.12: -2.61,-2.16 -2.61,-2.61 -2.16,-2.61 ; -2.61,2.61 -2.16,2.61 ; 2.16,-2.61 2.61,-2.61 2.61,-2.16 ; 2.16,2.61 2.61,2.61 2.61,2.16
F.Paste:
  region: -2.065,1.763 -2.065,1.74 -2.81,1.74 -2.81,1.86 -2.162,1.86
  region: -2.065,-1.763 -2.162,-1.86 -2.81,-1.86 -2.81,-1.74 -2.065,-1.74
  region: -1.74,-2.81 -1.86,-2.81 -1.86,-2.162 -1.763,-2.065 -1.74,-2.065
  region: 1.86,-2.162 1.86,-2.81 1.74,-2.81 1.74,-2.065 1.763,-2.065
  region: 2.81,-1.86 2.162,-1.86 2.065,-1.763 2.065,-1.74 2.81,-1.74
  region: 2.81,1.74 2.065,1.74 2.065,1.763 2.162,1.86 2.81,1.86
  region: 1.86,2.162 1.763,2.065 1.74,2.065 1.74,2.81 1.86,2.81
  region: -1.74,2.065 -1.763,2.065 -1.86,2.162 -1.86,2.81 -1.74,2.81
F.Mask:
  region: -2.065,1.763 -2.065,1.74 -2.81,1.74 -2.81,1.86 -2.162,1.86
  region: -2.065,-1.763 -2.162,-1.86 -2.81,-1.86 -2.81,-1.74 -2.065,-1.74
  region: -1.74,-2.81 -1.86,-2.81 -1.86,-2.162 -1.763,-2.065 -1.74,-2.065
  region: 1.86,-2.162 1.86,-2.81 1.74,-2.81 1.74,-2.065 1.763,-2.065
  region: 2.81,-1.86 2.162,-1.86 2.065,-1.763 2.065,-1.74 2.81,-1.74
  region: 2.81,1.74 2.065,1.74 2.065,1.763 2.162,1.86 2.81,1.86
  region: 1.86,2.162 1.763,2.065 1.74,2.065 1.74,2.81 1.86,2.81
  region: -1.74,2.065 -1.763,2.065 -1.86,2.162 -1.86,2.81 -1.74,2.81
F.CrtYd:
  lines w0.05: -3.1,-3.1 3.1,-3.1 3.1,3.1 -3.1,3.1 -3.1,-3.1
F.Fab:
  lines w0.1: -2.5,-2.5 -2.5,1.5 -1.5,2.5 2.5,2.5 2.5,-2.5 -2.5,-2.5
  text "'.Designator'" at -4.047,-0.84 h1

## TQFN-48-1EP_7x7mm_P0.5mm_EP5.1x5.1mm [mm]
pads (58):
  rrect25% 0.875x0.25 smd: 1(-3.437,2.75) 2(-3.437,2.25) 3(-3.437,1.75) 4(-3.437,1.25) 5(-3.437,0.75) 6(-3.437,0.25) 7(-3.437,-0.25) 8(-3.437,-0.75) 9(-3.437,-1.25) 10(-3.437,-1.75) 11(-3.437,-2.25) 12(-3.437,-2.75) 25(3.437,-2.75) 26(3.437,-2.25) 27(3.437,-1.75) 28(3.437,-1.25) 29(3.437,-0.75) 30(3.437,-0.25) 31(3.437,0.25) 32(3.437,0.75) 33(3.437,1.25) 34(3.437,1.75) 35(3.437,2.25) 36(3.437,2.75)
  rrect25% 0.25x0.875 smd: 13(-2.75,-3.437) 14(-2.25,-3.437) 15(-1.75,-3.437) 16(-1.25,-3.437) 17(-0.75,-3.437) 18(-0.25,-3.437) 19(0.25,-3.437) 20(0.75,-3.437) 21(1.25,-3.437) 22(1.75,-3.437) 23(2.25,-3.437) 24(2.75,-3.437) 37(2.75,3.437) 38(2.25,3.437) 39(1.75,3.437) 40(1.25,3.437) 41(0.75,3.437) 42(0.25,3.437) 43(-0.25,3.437) 44(-0.75,3.437) 45(-1.25,3.437) 46(-1.75,3.437) 47(-2.25,3.437) 48(-2.75,3.437)
  rect 5.1x5.1 smd: 49(0,0)
  rrect18% 1.37x1.37 on Top Paste: Un1(-1.7,0) Un2(1.7,-1.7) Un3(0,1.7) Un4(-1.7,-1.7) Un5(1.7,1.7) Un6(1.7,0) Un7(-1.7,1.7) Un8(0,0) Un9(0,-1.7)
F.SilkS:
  lines w0.12: -3.61,-3.135 -3.61,-3.61 -3.135,-3.61 ; -3.61,3.61 -3.135,3.61 ; 3.135,-3.61 3.61,-3.61 3.61,-3.135 ; 3.135,3.61 3.61,3.61 3.61,3.135
F.CrtYd:
  lines w0.05: -4.12,-4.12 4.12,-4.12 4.12,4.12 -4.12,4.12 -4.12,-4.12
F.Fab:
  lines w0.1: -3.5,-3.5 -3.5,2.5 -2.5,3.5 3.5,3.5 3.5,-3.5 -3.5,-3.5
  text "'.Designator'" at -4.047,-0.84 h1

## TQFN-48-1EP_7x7mm_P0.5mm_EP5.1x5.1mm_ThermalVias [mm]
pads (75):
  rrect25% 0.875x0.25 smd: 1(-3.437,2.75) 2(-3.437,2.25) 3(-3.437,1.75) 4(-3.437,1.25) 5(-3.437,0.75) 6(-3.437,0.25) 7(-3.437,-0.25) 8(-3.437,-0.75) 9(-3.437,-1.25) 10(-3.437,-1.75) 11(-3.437,-2.25) 12(-3.437,-2.75) 25(3.437,-2.75) 26(3.437,-2.25) 27(3.437,-1.75) 28(3.437,-1.25) 29(3.437,-0.75) 30(3.437,-0.25) 31(3.437,0.25) 32(3.437,0.75) 33(3.437,1.25) 34(3.437,1.75) 35(3.437,2.25) 36(3.437,2.75)
  rrect25% 0.25x0.875 smd: 13(-2.75,-3.437) 14(-2.25,-3.437) 15(-1.75,-3.437) 16(-1.25,-3.437) 17(-0.75,-3.437) 18(-0.25,-3.437) 19(0.25,-3.437) 20(0.75,-3.437) 21(1.25,-3.437) 22(1.75,-3.437) 23(2.25,-3.437) 24(2.75,-3.437) 37(2.75,3.437) 38(2.25,3.437) 39(1.75,3.437) 40(1.25,3.437) 41(0.75,3.437) 42(0.25,3.437) 43(-0.25,3.437) 44(-0.75,3.437) 45(-1.25,3.437) 46(-1.75,3.437) 47(-2.25,3.437) 48(-2.75,3.437)
  round 0.5 hole 0.2: 49(-2.3,-2.3) 49(-2.3,-0.767) 49(-2.3,0.767) 49(-2.3,2.3) 49(-0.767,-2.3) 49(-0.767,-0.767) 49(-0.767,0.767) 49(-0.767,2.3) 49(0.767,-2.3) 49(0.767,-0.767) 49(0.767,0.767) 49(0.767,2.3) 49(2.3,-2.3) 49(2.3,-0.767) 49(2.3,0.767) 49(2.3,2.3)
  rect 5.1x5.1 smd far side: 49(0,0)
  rect 5.1x5.1 smd: 49(0,0)
  rrect17% 1.47x1.47 on Top Paste: Un1(1.7,-1.7) Un2(1.7,0) Un3(-1.7,0) Un4(0,1.7) Un5(0,0) Un6(-1.7,-1.7) Un7(-1.7,1.7) Un8(1.7,1.7) Un9(0,-1.7)
F.SilkS:
  lines w0.12: -3.61,-3.135 -3.61,-3.61 -3.135,-3.61 ; -3.61,3.61 -3.135,3.61 ; 3.135,-3.61 3.61,-3.61 3.61,-3.135 ; 3.135,3.61 3.61,3.61 3.61,3.135
F.CrtYd:
  lines w0.05: -4.12,-4.12 -4.12,4.12 4.12,4.12 4.12,-4.12 -4.12,-4.12
F.Fab:
  lines w0.1: -3.5,-3.5 3.5,-3.5 3.5,3.5 -2.5,3.5 -3.5,2.5 -3.5,-3.5
  text "'.Designator'" at -4.047,-0.84 h1

## UDFN-4-1EP_1x1mm_P0.65mm_EP0.48x0.48mm [mm]
pads (5):
  rect 0.22x0.25 smd: 1(-0.54,0.325) 2(-0.54,-0.325) 3(0.54,-0.325) 4(0.54,0.325)
  rect 0.48x0.48 smd rot 45: 5(0,0)
F.Cu:
  region: -0.43,0.2 -0.43,0.45 -0.18,0.45
  region: -0.25,-0.38 -0.25,-0.45 -0.43,-0.45 -0.43,-0.2
  region: 0.43,-0.45 0.25,-0.45 0.25,-0.38 0.43,-0.2
  region: 0.43,0.2 0.25,0.38 0.25,0.45 0.43,0.45
F.SilkS:
  lines w0.12: -0.61,-0.63 0.61,-0.63 ; 0,0.63 0.61,0.63
F.Paste:
  region: -0.43,0.2 -0.43,0.45 -0.18,0.45
  region: -0.25,-0.38 -0.25,-0.45 -0.43,-0.45 -0.43,-0.2
  region: 0.43,-0.45 0.25,-0.45 0.25,-0.38 0.43,-0.2
  region: 0.43,0.2 0.25,0.38 0.25,0.45 0.43,0.45
F.Mask:
  region: -0.43,0.2 -0.43,0.45 -0.18,0.45
  region: -0.25,-0.38 -0.25,-0.45 -0.43,-0.45 -0.43,-0.2
  region: 0.43,-0.45 0.25,-0.45 0.25,-0.38 0.43,-0.2
  region: 0.43,0.2 0.25,0.38 0.25,0.45 0.43,0.45
F.CrtYd:
  lines w0.05: -0.9,-0.75 -0.9,0.75 0.9,0.75 0.9,-0.75 -0.9,-0.75
F.Fab:
  lines w0.1: -0.5,-0.5 -0.5,0.12 -0.12,0.5 0.5,0.5 0.5,-0.5 -0.5,-0.5
  text "'.Designator'" at -0.959,-0.278 h0.25

## UDFN-9_1.0x3.8mm_P0.5mm [mm]
pads (9):
  rect 0.6x0.2 smd: 1(-0.475,1.7) 2(-0.475,0.8) 3(-0.475,0) 4(-0.475,-0.8) 5(-0.475,-1.7) 6(0.475,-1.3) 7(0.475,-0.4) 8(0.475,0.4) 9(0.475,1.3)
F.SilkS:
  lines w0.12: -0.65,-1.35 -0.65,-1.15 ; -0.65,-0.45 -0.65,-0.35 ; -0.65,0.35 -0.65,0.45 ; -0.55,-2.05 0.65,-2.05 0.65,-1.65 ; 0,2.05 0.65,2.05 0.65,1.65 ; 0.65,-0.95 0.65,-0.75 ; 0.65,-0.05 0.65,0.05 ; 0.65,0.75 0.65,0.95
F.CrtYd:
  lines w0.05: -1.03,-2.15 -1.03,2.15 1.03,2.15 1.03,-2.15 -1.03,-2.15
F.Fab:
  lines w0.1: -0.5,-1.9 -0.5,1.5 -0.1,1.9 0.5,1.9 0.5,-1.9 -0.5,-1.9
  text "'.Designator'" at 0.257,-1.219 h0.3